# Altium integrated library LEMO Unipole And Multipole Type Connectors.IntLib: 1566 symbols (part 6 of 13) (continued)
## EZG.0B.309.CLN
designator J?
Straight receptacle for printed circuit, Key (G), 0B series, Multipole Type with 9 Contacts; Manufacturer: LEMO; PartNumber: EZG.0B.309.CLN; Number of contacts: 9; Contact Diameter: 0.5 mm; AWG: 28; Rated Current(A): 2; DatasheetVersion: Jun-14; PackageReference: EZG.0B.309.CLN; PackageDescription: Straight receptacle for printed circuit, Key(G) for Printed Circuit; Supplier 1: Mouser; Supplier Part Number 1: 736-EZG.0B.309.CLN; Supplier 2: Digi-Key; Supplier Part Number 2: EZG.0B.309.CLN-ND; ComponentLink1Description: Manufacturer URL; ComponentLink1URL: http://www.lemo.com; ComponentLink2Description: Datasheet; ComponentLink2URL: http://intra.lemo.ch/catalog/ROW/UK_English/unipole_multipole.pdf
footprint EZG.0B.309.CLN (Socket, Female, Height 15 mm, Through hole)
pins: 1, 2, 3, 4, 5, 6, 7, 8, 9, 11, 12, 13, 14

## HEN.0F.302.XLNP
designator J?
Fixed receptacle, nut fixing, for printed circuit (back panel mounting), Key (N), 0F series, Multipole Type with 2 Contacts; Manufacturer: LEMO; PartNumber: HEN.0F.302.XLNP; Number of contacts: 2; Contact Diameter: 0.9 mm; AWG: 22; Test voltage Contact-Contact(Kv rms): 1.45; Test voltage Contact-Shell(Kv rms): 1.2; Rate Current(A): 10; DatasheetVersion: Jun-14; PackageReference: HEN.0F.302.XLNP; PackageDescription: Fixed receptacle, nut fixing, for printed circuit (back panel mounting), Key(N) for Printed Circuit; Supplier 1: Mouser; Supplier Part Number 1: 736-HEN0F302XLNP; Supplier 2: Digi-Key; Supplier Part Number 2: HEN.0F.302.XLNP-ND; ComponentLink1Description: Manufacturer URL; ComponentLink1URL: http://www.lemo.com; ComponentLink2Description: Datasheet; ComponentLink2URL: http://intra.lemo.ch/catalog/ROW/UK_English/f_series.pdf
footprint HEN.0F.302.XLNP (Socket, Female, Body 10mm dia. Height 21.6 mm, Through hole)
pins: 1, 2, 4, 5, 6, 7

## HEN.0F.303.CLNP
designator J?
Fixed receptacle, nut fixing, for printed circuit (back panel mounting), Key (N), 0F series, Multipole Type with 3 Contacts; Manufacturer: LEMO; PartNumber: HEN.0F.303.CLNP; Number of contacts: 3; Contact Diameter: 0.9 mm; AWG: 22; Test voltage Contact-Contact(Kv rms): 1.7; Test voltage Contact-Shell(Kv rms): 1.6; Rate Current(A): 8; DatasheetVersion: Jun-14; PackageReference: HEN.0F.303.CLNP; PackageDescription: Fixed receptacle, nut fixing, for printed circuit (back panel mounting), Key(N) for Printed Circuit; ComponentLink1Description: Manufacturer URL; ComponentLink1URL: http://www.lemo.com; ComponentLink2Description: Datasheet; ComponentLink2URL: http://intra.lemo.ch/catalog/ROW/UK_English/f_series.pdf
footprint HEN.0F.303.CLNP (Socket, Female, Body 10mm dia. Height 21.6 mm, Through hole)
pins: 1, 2, 3, 5, 6, 7, 8

## HEN.0F.303.XLNP
designator J?
Fixed receptacle, nut fixing, for printed circuit (back panel mounting), Key (N), 0F series, Multipole Type with 3 Contacts; Manufacturer: LEMO; PartNumber: HEN.0F.303.XLNP; Number of contacts: 3; Contact Diameter: 0.9 mm; AWG: 22; Test voltage Contact-Contact(Kv rms): 1.7; Test voltage Contact-Shell(Kv rms): 1.6; Rate Current(A): 8; DatasheetVersion: Jun-14; PackageReference: HEN.0F.303.XLNP; PackageDescription: Fixed receptacle, nut fixing, for printed circuit (back panel mounting), Key(N) for Printed Circuit; Supplier 1: Mouser; Supplier Part Number 1: 736-HEN0F303XLNP; Supplier 2: Digi-Key; Supplier Part Number 2: HEN.0F.303.XLNP-ND; ComponentLink1Description: Manufacturer URL; ComponentLink1URL: http://www.lemo.com; ComponentLink2Description: Datasheet; ComponentLink2URL: http://intra.lemo.ch/catalog/ROW/UK_English/f_series.pdf
footprint HEN.0F.303.XLNP (Socket, Female, Body 10mm dia. Height 21.6 mm, Through hole)
pins: 1, 2, 3, 5, 6, 7, 8

## HEN.0F.304.CLNP
designator J?
Fixed receptacle, nut fixing, for printed circuit (back panel mounting), Key (N), 0F series, Multipole Type with 4 Contacts; Manufacturer: LEMO; PartNumber: HEN.0F.304.CLNP; Number of contacts: 4; Contact Diameter: 0.7 mm; AWG: 24; Test voltage Contact-Contact(Kv rms): 1.35; Test voltage Contact-Shell(Kv rms): 1.1; Rate Current(A): 7; DatasheetVersion: Jun-14; PackageReference: HEN.0F.304.CLNP; PackageDescription: Fixed receptacle, nut fixing, for printed circuit (back panel mounting), Key(N) for Printed Circuit; Supplier 1: Mouser; Supplier Part Number 1: 736-HEN0F304CLNP; Supplier 2: Digi-Key; Supplier Part Number 2: HEN.0F.304.CLNP-ND; ComponentLink1Description: Manufacturer URL; ComponentLink1URL: http://www.lemo.com; ComponentLink2Description: Datasheet; ComponentLink2URL: http://intra.lemo.ch/catalog/ROW/UK_English/f_series.pdf
footprint HEN.0F.304.CLNP (Socket, Female, Body 10mm dia. Height 21.6 mm, Through hole)
pins: 1, 2, 3, 4, 6, 7, 8, 9

## HEN.0F.304.XLNP
designator J?
Fixed receptacle, nut fixing, for printed circuit (back panel mounting), Key (N), 0F series, Multipole Type with 4 Contacts; Manufacturer: LEMO; PartNumber: HEN.0F.304.XLNP; Number of contacts: 4; Contact Diameter: 0.7 mm; AWG: 24; Test voltage Contact-Contact(Kv rms): 1.35; Test voltage Contact-Shell(Kv rms): 1.1; Rate Current(A): 7; DatasheetVersion: Jun-14; PackageReference: HEN.0F.304.XLNP; PackageDescription: Fixed receptacle, nut fixing, for printed circuit (back panel mounting), Key(N) for Printed Circuit; Supplier 1: Mouser; Supplier Part Number 1: 736-HEN0F304XLNP; Supplier 2: Newark; Supplier Part Number 2: 47T7193; Supplier 3: Digi-Key; Supplier Part Number 3: HEN.0F.304.XLNP-ND; ComponentLink1Description: Manufacturer URL; ComponentLink1URL: http://www.lemo.com; ComponentLink2Description: Datasheet; ComponentLink2URL: http://intra.lemo.ch/catalog/ROW/UK_English/f_series.pdf
footprint HEN.0F.304.XLNP (Socket, Female, Body 10mm dia. Height 21.6 mm, Through hole)
pins: 1, 2, 3, 4, 6, 7, 8, 9

## HEN.0F.305.CLNP
designator J?
Fixed receptacle, nut fixing, for printed circuit (back panel mounting), Key (N), 0F series, Multipole Type with 5 Contacts; Manufacturer: LEMO; PartNumber: HEN.0F.305.CLNP; Number of contacts: 5; Contact Diameter: 0.7 mm; AWG: 24; Test voltage Contact-Contact(Kv rms): 1.25; Test voltage Contact-Shell(Kv rms): 1.2; Rate Current(A): 6.5; DatasheetVersion: Jun-14; PackageReference: HEN.0F.305.CLNP; PackageDescription: Fixed receptacle, nut fixing, for printed circuit (back panel mounting), Key(N) for Printed Circuit; Supplier 1: Mouser; Supplier Part Number 1: 736-HEN0F305CLNP; Supplier 2: Digi-Key; Supplier Part Number 2: HEN.0F.305.CLNP-ND; ComponentLink1Description: Manufacturer URL; ComponentLink1URL: http://www.lemo.com; ComponentLink2Description: Datasheet; ComponentLink2URL: http://intra.lemo.ch/catalog/ROW/UK_English/f_series.pdf
footprint HEN.0F.305.CLNP (Socket, Female, Body 10mm dia. Height 21.6 mm, Through hole)
pins: 1, 2, 3, 4, 5, 7, 8, 9, 10

## HEN.0F.305.XLNP
designator J?
Fixed receptacle, nut fixing, for printed circuit (back panel mounting), Key (N), 0F series, Multipole Type with 5 Contacts; Manufacturer: LEMO; PartNumber: HEN.0F.305.XLNP; Number of contacts: 5; Contact Diameter: 0.7 mm; AWG: 24; Test voltage Contact-Contact(Kv rms): 1.25; Test voltage Contact-Shell(Kv rms): 1.2; Rate Current(A): 6.5; DatasheetVersion: Jun-14; PackageReference: HEN.0F.305.XLNP; PackageDescription: Fixed receptacle, nut fixing, for printed circuit (back panel mounting), Key(N) for Printed Circuit; Supplier 1: Mouser; Supplier Part Number 1: 736-HEN0F305XLNP; Supplier 2: Newark; Supplier Part Number 2: 47W6198; Supplier 3: Digi-Key; Supplier Part Number 3: 1124-1407-ND; ComponentLink1Description: Manufacturer URL; ComponentLink1URL: http://www.lemo.com; ComponentLink2Description: Datasheet; ComponentLink2URL: http://intra.lemo.ch/catalog/ROW/UK_English/f_series.pdf
footprint HEN.0F.305.XLNP (Socket, Female, Body 10mm dia. Height 21.6 mm, Through hole)
pins: 1, 2, 3, 4, 5, 7, 8, 9, 10

## HEN.0M.302.XLNP
designator J?
Fixed receptacle, nut fixing for printed circuit, watertight, Key (N), 0M series, Multipole Type with 2 Contacts; Manufacturer: LEMO; PartNumber: HEN.0M.302.XLNP; Number of contacts: 2; Contact Diameter: 0.9 mm; AWG: 22; Rated Current(A): 10; DatasheetVersion: Jun-14; PackageReference: HEN.0M.302.XLNP; PackageDescription: Fixed receptacle, nut fixing for printed circuit, watertight, Key(N) for Printed Circuit; ComponentLink1Description: Manufacturer URL; ComponentLink1URL: http://www.lemo.com; ComponentLink2Description: Datasheet; ComponentLink2URL: http://intra.lemo.ch/catalog/ROW/UK_English/M_series.pdf
footprint HEN.0M.302.XLNP (Socket, Female, Body 13mm dia. Height 20.8 mm, Through hole)
pins: 1, 2, 4, 5, 6, 7

## HEN.0M.303.XLNP
designator J?
Fixed receptacle, nut fixing for printed circuit, watertight, Key (N), 0M series, Multipole Type with 3 Contacts; Manufacturer: LEMO; PartNumber: HEN.0M.303.XLNP; Number of contacts: 3; Contact Diameter: 0.9 mm; AWG: 22; Rated Current(A): 8; DatasheetVersion: Jun-14; PackageReference: HEN.0M.303.XLNP; PackageDescription: Fixed receptacle, nut fixing for printed circuit, watertight, Key(N) for Printed Circuit; Supplier 1: Mouser; Supplier Part Number 1: 736-HEN0M303XLNP; Supplier 2: Newark; Supplier Part Number 2: 90W4179; Supplier 3: Farnell; Supplier Part Number 3: 1859190; Supplier 4: Digi-Key; Supplier Part Number 4: HEN.0M.303.XLNP-ND; ComponentLink1Description: Manufacturer URL; ComponentLink1URL: http://www.lemo.com; ComponentLink2Description: Datasheet; ComponentLink2URL: http://intra.lemo.ch/catalog/ROW/UK_English/M_series.pdf
footprint HEN.0M.303.XLNP (Socket, Female, Body 13mm dia. Height 20.8 mm, Through hole)
pins: 1, 2, 3, 5, 6, 7, 8

## HEN.0M.304.XLNP
designator J?
Fixed receptacle, nut fixing for printed circuit, watertight, Key (N), 0M series, Multipole Type with 4 Contacts; Manufacturer: LEMO; PartNumber: HEN.0M.304.XLNP; Number of contacts: 4; Contact Diameter: 0.7 mm; AWG: 24; Rated Current(A): 7; DatasheetVersion: Jun-14; PackageReference: HEN.0M.304.XLNP; PackageDescription: Fixed receptacle, nut fixing for printed circuit, watertight, Key(N) for Printed Circuit; Supplier 1: Mouser; Supplier Part Number 1: 736-HEN0M304XLNP; Supplier 2: Digi-Key; Supplier Part Number 2: HEN.0M.304.XLNP-ND; ComponentLink1Description: Manufacturer URL; ComponentLink1URL: http://www.lemo.com; ComponentLink2Description: Datasheet; ComponentLink2URL: http://intra.lemo.ch/catalog/ROW/UK_English/M_series.pdf
footprint HEN.0M.304.XLNP (Socket, Female, Body 13mm dia. Height 20.8 mm, Through hole)
pins: 1, 2, 3, 4, 6, 7, 8, 9

## HEN.0M.305.XLNP
designator J?
Fixed receptacle, nut fixing for printed circuit, watertight, Key (N), 0M series, Multipole Type with 5 Contacts; Manufacturer: LEMO; PartNumber: HEN.0M.305.XLNP; Number of contacts: 5; Contact Diameter: 0.7 mm; AWG: 24; Rated Current(A): 6.5; DatasheetVersion: Jun-14; PackageReference: HEN.0M.305.XLNP; PackageDescription: Fixed receptacle, nut fixing for printed circuit, watertight, Key(N) for Printed Circuit; Supplier 1: Mouser; Supplier Part Number 1: 736-HEN0M305XLNP; Supplier 2: Digi-Key; Supplier Part Number 2: HEN.0M.305.XLNP-ND; ComponentLink1Description: Manufacturer URL; ComponentLink1URL: http://www.lemo.com; ComponentLink2Description: Datasheet; ComponentLink2URL: http://intra.lemo.ch/catalog/ROW/UK_English/M_series.pdf
footprint HEN.0M.305.XLNP (Socket, Female, Body 13mm dia. Height 20.8 mm, Through hole)
pins: 1, 2, 3, 4, 5, 7, 8, 9, 10

## HEN.1F.305.XLNP
designator J?
Fixed receptacle, nut fixing, for printed circuit (back panel mounting), Key (N), 1F series, Multipole Type with 5 Contacts; Manufacturer: LEMO; PartNumber: HEN.1F.305.XLNP; Number of contacts: 5; Contact Diameter: 0.9 mm; AWG: 22; Test voltage Contact-Contact(Kv rms): 1.3; Test voltage Contact-Shell(Kv rms): 1.55; Rate Current(A): 9; DatasheetVersion: Jun-14; PackageReference: HEN.1F.305.XLNP; PackageDescription: Fixed receptacle, nut fixing, for printed circuit (back panel mounting), Key(N) for Printed Circuit; Supplier 1: Mouser; Supplier Part Number 1: 736-HEN1F305XLNP; Supplier 2: Newark; Supplier Part Number 2: 65R6991; Supplier 3: Digi-Key; Supplier Part Number 3: HEN.1F.305.XLNP-ND; ComponentLink1Description: Manufacturer URL; ComponentLink1URL: http://www.lemo.com; ComponentLink2Description: Datasheet; ComponentLink2URL: http://intra.lemo.ch/catalog/ROW/UK_English/f_series.pdf
footprint HEN.1F.305.XLNP (Socket, Female, Body 13mm dia. Height 21.6 mm, Through hole)
pins: 1, 2, 3, 4, 5, 7, 8, 9, 10

## HEN.1F.307.CLNP
designator J?
Fixed receptacle, nut fixing, for printed circuit (back panel mounting), Key (N), 1F series, Multipole Type with 7 Contacts; Manufacturer: LEMO; PartNumber: HEN.1F.307.CLNP; Number of contacts: 7; Contact Diameter: 0.7 mm; AWG: 24; Test voltage Contact-Contact(Kv rms): 1.45; DatasheetVersion: Jun-14; PackageReference: HEN.1F.307.CLNP; PackageDescription: Fixed receptacle, nut fixing, for printed circuit (back panel mounting), Key(N) for Printed Circuit; Test voltage Contact-Shell(Kv rms): 1.45; Rate Current(A): 7; ComponentLink1Description: Manufacturer URL; ComponentLink1URL: http://www.lemo.com; ComponentLink2Description: Datasheet; ComponentLink2URL: http://intra.lemo.ch/catalog/ROW/UK_English/f_series.pdf
footprint HEN.1F.307.CLNP (Socket, Female, Body 13mm dia. Height 21.6 mm, Through hole)
pins: 1, 2, 3, 4, 5, 6, 7, 9, 10, 11, 12

## HEN.1F.307.XLNP
designator J?
Fixed receptacle, nut fixing, for printed circuit (back panel mounting), Key (N), 1F series, Multipole Type with 7 Contacts; Manufacturer: LEMO; PartNumber: HEN.1F.307.XLNP; Number of contacts: 7; Contact Diameter: 0.7 mm; AWG: 24; Test voltage Contact-Contact(Kv rms): 1.45; DatasheetVersion: Jun-14; PackageReference: HEN.1F.307.XLNP; PackageDescription: Fixed receptacle, nut fixing, for printed circuit (back panel mounting), Key(N) for Printed Circuit; Supplier 1: Mouser; Supplier Part Number 1: 736-HEN1F307XLNP; Supplier 2: Digi-Key; Supplier Part Number 2: HEN.1F.307.XLNP-ND; Test voltage Contact-Shell(Kv rms): 1.45; Rate Current(A): 7; ComponentLink1Description: Manufacturer URL; ComponentLink1URL: http://www.lemo.com; ComponentLink2Description: Datasheet; ComponentLink2URL: http://intra.lemo.ch/catalog/ROW/UK_English/f_series.pdf
footprint HEN.1F.307.XLNP (Socket, Female, Body 13mm dia. Height 21.6 mm, Through hole)
pins: 1, 2, 3, 4, 5, 6, 7, 9, 10, 11, 12

## HEN.1F.308.CLNP
designator J?
Fixed receptacle, nut fixing, for printed circuit (back panel mounting), Key (N), 1F series, Multipole Type with 8 Contacts; Manufacturer: LEMO; PartNumber: HEN.1F.308.CLNP; Number of contacts: 8; Contact Diameter: 0.7 mm; AWG: 24; Test voltage Contact-Contact(Kv rms): 1.3; Rate Current(A): 5; DatasheetVersion: Jun-14; PackageReference: HEN.1F.308.CLNP; PackageDescription: Fixed receptacle, nut fixing, for printed circuit (back panel mounting), Key(N) for Printed Circuit; Supplier 1: Mouser; Supplier Part Number 1: 736-HEN1F308CLNP; Supplier 2: Digi-Key; Supplier Part Number 2: HEN.1F.308.CLNP-ND; Test voltage Contact-Shell(Kv rms): 1.3; ComponentLink1Description: Manufacturer URL; ComponentLink1URL: http://www.lemo.com; ComponentLink2Description: Datasheet; ComponentLink2URL: http://intra.lemo.ch/catalog/ROW/UK_English/f_series.pdf
footprint HEN.1F.308.CLNP (Socket, Female, Body 13mm dia. Height 21.6 mm, Through hole)
pins: 1, 2, 3, 4, 5, 6, 7, 8, 10, 11, 12, 13

## HEN.1F.308.XLNP
designator J?
Fixed receptacle, nut fixing, for printed circuit (back panel mounting), Key (N), 1F series, Multipole Type with 8 Contacts; Manufacturer: LEMO; PartNumber: HEN.1F.308.XLNP; Number of contacts: 8; Contact Diameter: 0.7 mm; AWG: 24; Test voltage Contact-Contact(Kv rms): 1.3; Rate Current(A): 5; DatasheetVersion: Jun-14; PackageReference: HEN.1F.308.XLNP; PackageDescription: Fixed receptacle, nut fixing, for printed circuit (back panel mounting), Key(N) for Printed Circuit; Supplier 1: Mouser; Supplier Part Number 1: 736-HEN1F308XLNP; Supplier 2: Newark; Supplier Part Number 2: 30T1499; Supplier 3: Digi-Key; Supplier Part Number 3: HEN.1F.308.XLNP-ND; Test voltage Contact-Shell(Kv rms): 1.3; ComponentLink1Description: Manufacturer URL; ComponentLink1URL: http://www.lemo.com; ComponentLink2Description: Datasheet; ComponentLink2URL: http://intra.lemo.ch/catalog/ROW/UK_English/f_series.pdf
footprint HEN.1F.308.XLNP (Socket, Female, Body 13mm dia. Height 21.6 mm, Through hole)
pins: 1, 2, 3, 4, 5, 6, 7, 8, 10, 11, 12, 13

## HEN.1M.305.XLNP
designator J?
Fixed receptacle, nut fixing for printed circuit, watertight, Key (N), 1M series, Multipole Type with 5 Contacts; Manufacturer: LEMO; PartNumber: HEN.1M.305.XLNP; Number of contacts: 5; Contact Diameter: 0.9 mm; AWG: 22; Rated Current(A): 9; DatasheetVersion: Jun-14; PackageReference: HEN.1M.305.XLNP; PackageDescription: Fixed receptacle, nut fixing for printed circuit, watertight, Key(N) for Printed Circuit; Supplier 1: Newark; Supplier Part Number 1: 96W2627; Supplier 2: Farnell; Supplier Part Number 2: 1859192; ComponentLink1Description: Manufacturer URL; ComponentLink1URL: http://www.lemo.com; ComponentLink2Description: Datasheet; ComponentLink2URL: http://intra.lemo.ch/catalog/ROW/UK_English/M_series.pdf
footprint HEN.1M.305.XLNP (Socket, Female, Body 14mm dia. Height 20.8 mm, Through hole)
pins: 1, 2, 3, 4, 5, 7, 8, 9, 10

## HEN.1M.307.XLNP
designator J?
Fixed receptacle, nut fixing for printed circuit, watertight, Key (N), 1M series, Multipole Type with 7 Contacts; Manufacturer: LEMO; PartNumber: HEN.1M.307.XLNP; Number of contacts: 7; Contact Diameter: 0.7 mm; AWG: 24; DatasheetVersion: Jun-14; PackageReference: HEN.1M.307.XLNP; PackageDescription: Fixed receptacle, nut fixing for printed circuit, watertight, Key(N) for Printed Circuit; Supplier 1: Mouser; Supplier Part Number 1: 736-HEN1M307XLNP; Supplier 2: Digi-Key; Supplier Part Number 2: HEN.1M.307.XLNP-ND; Rated Current(A): 7; ComponentLink1Description: Manufacturer URL; ComponentLink1URL: http://www.lemo.com; ComponentLink2Description: Datasheet; ComponentLink2URL: http://intra.lemo.ch/catalog/ROW/UK_English/M_series.pdf
footprint HEN.1M.307.XLNP (Socket, Female, Body 14mm dia. Height 20.8 mm, Through hole)
pins: 1, 2, 3, 4, 5, 6, 7, 9, 10, 11, 12

## HEN.1M.308.CLNP
designator J?
Fixed receptacle, nut fixing for printed circuit, watertight, Key (N), 1M series, Multipole Type with 8 Contacts; Manufacturer: LEMO; PartNumber: HEN.1M.308.CLNP; Number of contacts: 8; Contact Diameter: 0.7 mm; AWG: 24; Rated Current(A): 5; DatasheetVersion: Jun-14; PackageReference: HEN.1M.308.CLNP; PackageDescription: Fixed receptacle, nut fixing for printed circuit, watertight, Key(N) for Printed Circuit; ComponentLink1Description: Manufacturer URL; ComponentLink1URL: http://www.lemo.com; ComponentLink2Description: Datasheet; ComponentLink2URL: http://intra.lemo.ch/catalog/ROW/UK_English/M_series.pdf
footprint HEN.1M.308.CLNP (Socket, Female, Body 14mm dia. Height 20.8 mm, Through hole)
pins: 1, 2, 3, 4, 5, 6, 7, 8, 10, 11, 12, 13

## HEN.1M.308.XLNP
designator J?
Fixed receptacle, nut fixing for printed circuit, watertight, Key (N), 1M series, Multipole Type with 8 Contacts; Manufacturer: LEMO; PartNumber: HEN.1M.308.XLNP; Number of contacts: 8; Contact Diameter: 0.7 mm; AWG: 24; Rated Current(A): 5; DatasheetVersion: Jun-14; PackageReference: HEN.1M.308.XLNP; PackageDescription: Fixed receptacle, nut fixing for printed circuit, watertight, Key(N) for Printed Circuit; Supplier 1: Mouser; Supplier Part Number 1: 736-HEN1M308XLNP; Supplier 2: Newark; Supplier Part Number 2: 63R3504; Supplier 3: Farnell; Supplier Part Number 3: 2077485; Supplier 4: Digi-Key; Supplier Part Number 4: 1124-1196-ND; ComponentLink1Description: Manufacturer URL; ComponentLink1URL: http://www.lemo.com; ComponentLink2Description: Datasheet; ComponentLink2URL: http://intra.lemo.ch/catalog/ROW/UK_English/M_series.pdf
footprint HEN.1M.308.XLNP (Socket, Female, Body 14mm dia. Height 20.8 mm, Through hole)
pins: 1, 2, 3, 4, 5, 6, 7, 8, 10, 11, 12, 13

## HEN.2F.308.XLNP
designator J?
Fixed receptacle, nut fixing, for printed circuit (back panel mounting), Key (N), 2F series, Multipole Type with 8 Contacts; Manufacturer: LEMO; PartNumber: HEN.2F.308.XLNP; Number of contacts: 8; Contact Diameter: 0.9 mm; AWG: 22; Test voltage Contact-Contact(Kv rms): 1.95; Rate Current(A): 10; DatasheetVersion: Jun-14; PackageReference: HEN.2F.308.XLNP; PackageDescription: Fixed receptacle, nut fixing, for printed circuit (back panel mounting), Key(N) for Printed Circuit; Supplier 1: Mouser; Supplier Part Number 1: 736-HEN2F308XLNP; Supplier 2: Digi-Key; Supplier Part Number 2: HEN.2F.308.XLNP-ND; Test voltage Contact-Shell(Kv rms): 1.95; ComponentLink1Description: Manufacturer URL; ComponentLink1URL: http://www.lemo.com; ComponentLink2Description: Datasheet; ComponentLink2URL: http://intra.lemo.ch/catalog/ROW/UK_English/f_series.pdf
footprint HEN.2F.308.XLNP (Socket, Female, Body 16mm dia. Height 21.6 mm, Through hole)
pins: 1, 2, 3, 4, 5, 6, 7, 8, 10, 11, 12, 13

## HEN.2F.310.CLNP
designator J?
Fixed receptacle, nut fixing, for printed circuit (back panel mounting), Key (N), 2F series, Multipole Type with 10 Contacts; Manufacturer: LEMO; PartNumber: HEN.2F.310.CLNP; Number of contacts: 10; Contact Diameter: 0.9 mm; AWG: 22; Test voltage Contact-Contact(Kv rms): 1.8; Test voltage Contact-Shell(Kv rms): 2.1; Rate Current(A): 8; DatasheetVersion: Jun-14; PackageReference: HEN.2F.310.CLNP; PackageDescription: Fixed receptacle, nut fixing, for printed circuit (back panel mounting), Key(N) for Printed Circuit; ComponentLink1Description: Manufacturer URL; ComponentLink1URL: http://www.lemo.com; ComponentLink2Description: Datasheet; ComponentLink2URL: http://intra.lemo.ch/catalog/ROW/UK_English/f_series.pdf
footprint HEN.2F.310.CLNP (Socket, Female, Body 16mm dia. Height 21.6 mm, Through hole)
pins: 1, 2, 3, 4, 5, 6, 7, 8, 9, 10, 12, 13, 14, 15

## HEN.2F.310.XLNP
designator J?
Fixed receptacle, nut fixing, for printed circuit (back panel mounting), Key (N), 2F series, Multipole Type with 10 Contacts; Manufacturer: LEMO; PartNumber: HEN.2F.310.XLNP; Number of contacts: 10; Contact Diameter: 0.9 mm; AWG: 22; Test voltage Contact-Contact(Kv rms): 1.8; Test voltage Contact-Shell(Kv rms): 2.1; Rate Current(A): 8; DatasheetVersion: Jun-14; PackageReference: HEN.2F.310.XLNP; PackageDescription: Fixed receptacle, nut fixing, for printed circuit (back panel mounting), Key(N) for Printed Circuit; Supplier 1: Mouser; Supplier Part Number 1: 736-HEN2F310XLNP; Supplier 2: Newark; Supplier Part Number 2: 47T7194; Supplier 3: Digi-Key; Supplier Part Number 3: HEN.2F.310.XLNP-ND; ComponentLink1Description: Manufacturer URL; ComponentLink1URL: http://www.lemo.com; ComponentLink2Description: Datasheet; ComponentLink2URL: http://intra.lemo.ch/catalog/ROW/UK_English/f_series.pdf
footprint HEN.2F.310.XLNP (Socket, Female, Body 16mm dia. Height 21.6 mm, Through hole)
pins: 1, 2, 3, 4, 5, 6, 7, 8, 9, 10, 12, 13, 14, 15

## HEN.2F.310.XLNPS
designator J?
Fixed receptacle, nut fixing, for printed circuit (back panel mounting), Key (N), 2F series, Multipole Type with 10 Contacts; Manufacturer: LEMO; PartNumber: HEN.2F.310.XLNPS; Number of contacts: 10; Contact Diameter: 0.9 mm; AWG: 22; Test voltage Contact-Contact(Kv rms): 1.8; Test voltage Contact-Shell(Kv rms): 2.1; Rate Current(A): 8; DatasheetVersion: Jun-14; PackageReference: HEN.2F.310.XLNPS; PackageDescription: Fixed receptacle, nut fixing, for printed circuit (back panel mounting), Key(N) for Printed Circuit; Supplier 1: Mouser; Supplier Part Number 1: N/A; ComponentLink1Description: Manufacturer URL; ComponentLink1URL: http://www.lemo.com; ComponentLink2Description: Datasheet; ComponentLink2URL: http://intra.lemo.ch/catalog/ROW/UK_English/f_series.pdf
footprint HEN.2F.310.XLNPS (Socket, Female, Body 16mm dia. Height 21.6 mm, Through hole)
pins: 1, 2, 3, 4, 5, 6, 7, 8, 9, 10, 12, 13, 14, 15

## HEN.2F.312.CLNP
designator J?
Fixed receptacle, nut fixing, for printed circuit (back panel mounting), Key (N), 2F series, Multipole Type with 12 Contacts; Manufacturer: LEMO; PartNumber: HEN.2F.312.CLNP; Number of contacts: 12; Contact Diameter: 0.7 mm; AWG: 24; Test voltage Contact-Contact(Kv rms): 1.65; Test voltage Contact-Shell(Kv rms): 2; Rate Current(A): 7; DatasheetVersion: Jun-14; PackageReference: HEN.2F.312.CLNP; PackageDescription: Fixed receptacle, nut fixing, for printed circuit (back panel mounting), Key(N) for Printed Circuit; ComponentLink1Description: Manufacturer URL; ComponentLink1URL: http://www.lemo.com; ComponentLink2Description: Datasheet; ComponentLink2URL: http://intra.lemo.ch/catalog/ROW/UK_English/f_series.pdf
footprint HEN.2F.312.CLNP (Socket, Female, Body 16mm dia. Height 21.6 mm, Through hole)
pins: 1, 2, 3, 4, 5, 6, 7, 8, 9, 10, 11, 12, 14, 15, 16, 17

## HEN.2F.312.XLNP
designator J?
Fixed receptacle, nut fixing, for printed circuit (back panel mounting), Key (N), 2F series, Multipole Type with 12 Contacts; Manufacturer: LEMO; PartNumber: HEN.2F.312.XLNP; Number of contacts: 12; Contact Diameter: 0.7 mm; AWG: 24; Test voltage Contact-Contact(Kv rms): 1.65; Test voltage Contact-Shell(Kv rms): 2; Rate Current(A): 7; DatasheetVersion: Jun-14; PackageReference: HEN.2F.312.XLNP; PackageDescription: Fixed receptacle, nut fixing, for printed circuit (back panel mounting), Key(N) for Printed Circuit; Supplier 1: Mouser; Supplier Part Number 1: 736-HEN2F312XLNP; Supplier 2: Digi-Key; Supplier Part Number 2: HEN.2F.312.XLNP-ND; ComponentLink1Description: Manufacturer URL; ComponentLink1URL: http://www.lemo.com; ComponentLink2Description: Datasheet; ComponentLink2URL: http://intra.lemo.ch/catalog/ROW/UK_English/f_series.pdf
footprint HEN.2F.312.XLNP (Socket, Female, Body 16mm dia. Height 21.6 mm, Through hole)
pins: 1, 2, 3, 4, 5, 6, 7, 8, 9, 10, 11, 12, 14, 15, 16, 17

## HEN.2F.319.CLNP
designator J?
Fixed receptacle, nut fixing, for printed circuit (back panel mounting), Key (N), 2F series, Multipole Type with 19 Contacts; Manufacturer: LEMO; PartNumber: HEN.2F.319.CLNP; Number of contacts: 19; Contact Diameter: 0.7 mm; AWG: 24; Test voltage Contact-Contact(Kv rms): 1.55; Test voltage Contact-Shell(Kv rms): 1.65; Rate Current(A): 5; DatasheetVersion: Jun-14; PackageReference: HEN.2F.319.CLNP; PackageDescription: Fixed receptacle, nut fixing, for printed circuit (back panel mounting), Key(N) for Printed Circuit; Supplier 1: Mouser; Supplier Part Number 1: 736-HEN.2F.319.CLNP; Supplier 2: Digi-Key; Supplier Part Number 2: HEN.2F.319.CLNP-ND; ComponentLink1Description: Manufacturer URL; ComponentLink1URL: http://www.lemo.com; ComponentLink2Description: Datasheet; ComponentLink2URL: http://intra.lemo.ch/catalog/ROW/UK_English/f_series.pdf
footprint HEN.2F.319.CLNP (Socket, Female, Body 16mm dia. Height 21.6 mm, Through hole)
pins: 1, 2, 3, 4, 5, 6, 7, 8, 9, 10, 11, 12, 13, 14, 15, 16, 17, 18, 19, 21, 22, 23, 24

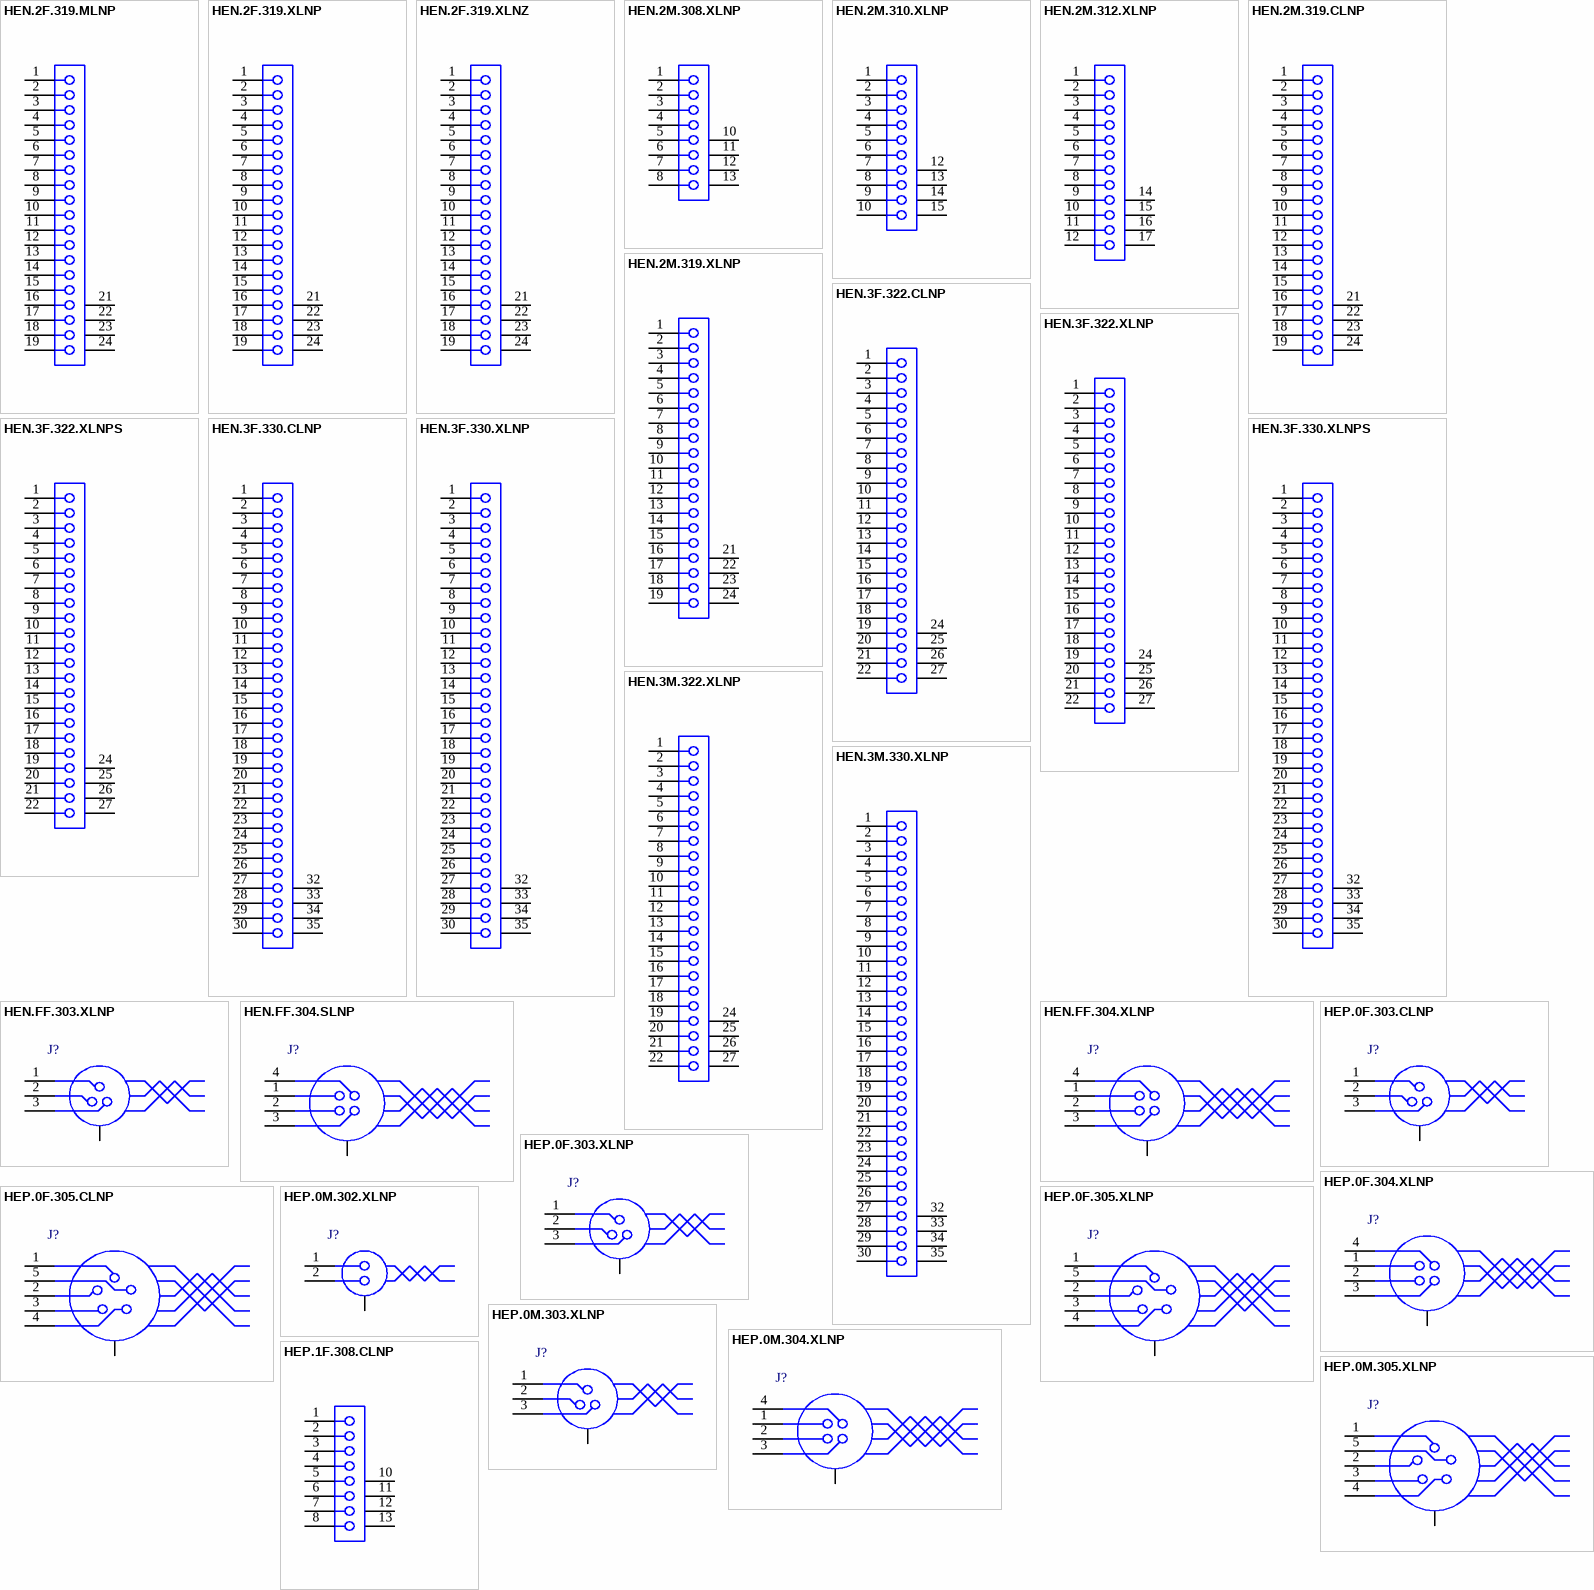
[diagram p19: symbols HEN.2F.319.MLNP to HEP.1F.308.CLNP]
